# Altium footprint library DSO.PcbLib: 86 footprints (part 5 of 6)
Each footprint in its own frame and in the unit in brackets; x right, y up, seen from the top. Pads: shape width x height; smd on the part's side, far side on the other; paste and mask are expansions set on the pad; w line width, h text height; cw(c..) or ccw(c..) is an arc to the next point about the centre after c.
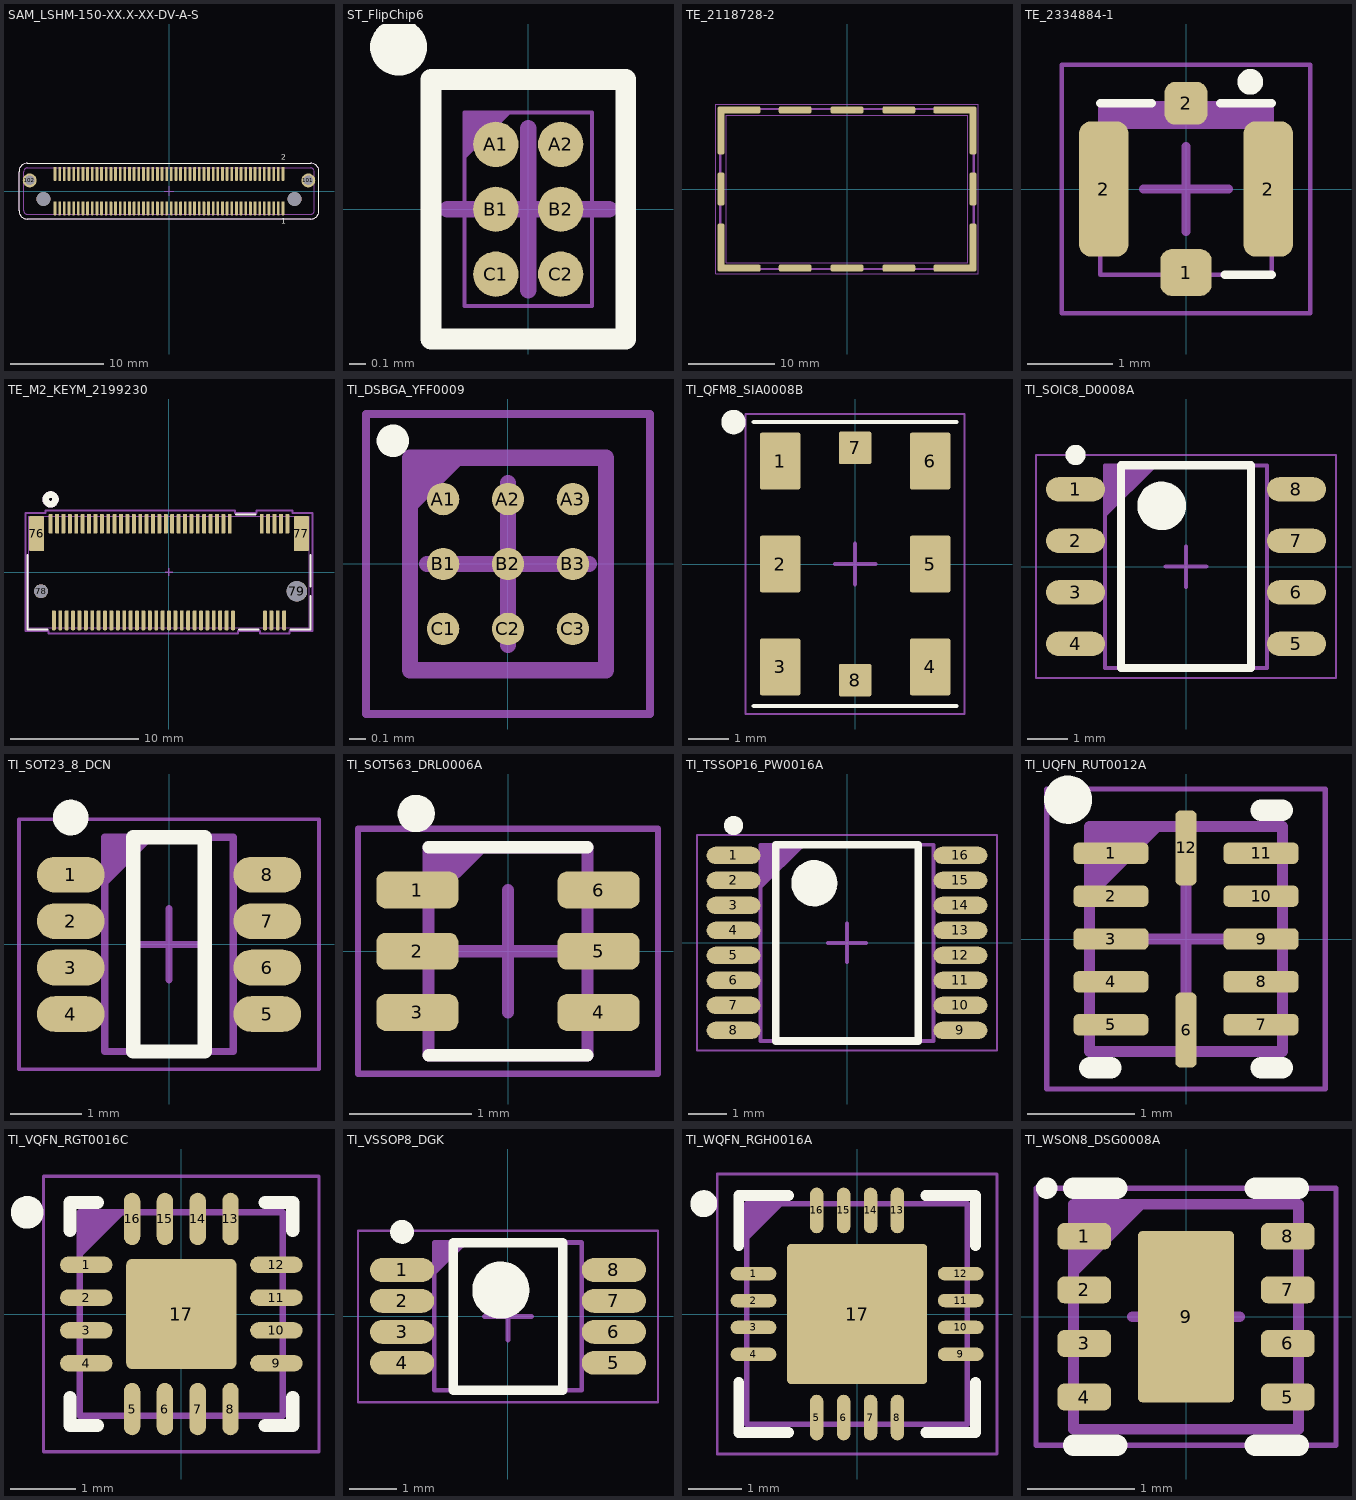
[diagram p4: the footprints below, top view; thin cyan lines are the x and y axes]

## SAM_LSHM-150-XX.X-XX-DV-A-S [mm]
pads (104):
  rrect50% 0.3x1.5 smd: 1(12.25,-1.85) 2(12.25,1.85) 3(11.75,-1.85) 4(11.75,1.85) 5(11.25,-1.85) 6(11.25,1.85) 7(10.75,-1.85) 8(10.75,1.85) 9(10.25,-1.85) 10(10.25,1.85) 11(9.75,-1.85) 12(9.75,1.85) 13(9.25,-1.85) 14(9.25,1.85) 15(8.75,-1.85) 16(8.75,1.85) 17(8.25,-1.85) 18(8.25,1.85) 19(7.75,-1.85) 20(7.75,1.85) 21(7.25,-1.85) 22(7.25,1.85) 23(6.75,-1.85) 24(6.75,1.85) 25(6.25,-1.85) 26(6.25,1.85) 27(5.75,-1.85) 28(5.75,1.85) 29(5.25,-1.85) 30(5.25,1.85) 31(4.75,-1.85) 32(4.75,1.85) 33(4.25,-1.85) 34(4.25,1.85) 35(3.75,-1.85) 36(3.75,1.85) 37(3.25,-1.85) 38(3.25,1.85) 39(2.75,-1.85) 40(2.75,1.85) 41(2.25,-1.85) 42(2.25,1.85) 43(1.75,-1.85) 44(1.75,1.85) 45(1.25,-1.85) 46(1.25,1.85) 47(0.75,-1.85) 48(0.75,1.85) 49(0.25,-1.85) 50(0.25,1.85) 51(-0.25,-1.85) 52(-0.25,1.85) 53(-0.75,-1.85) 54(-0.75,1.85) 55(-1.25,-1.85) 56(-1.25,1.85) 57(-1.75,-1.85) 58(-1.75,1.85) 59(-2.25,-1.85) 60(-2.25,1.85) 61(-2.75,-1.85) 62(-2.75,1.85) 63(-3.25,-1.85) 64(-3.25,1.85) 65(-3.75,-1.85) 66(-3.75,1.85) 67(-4.25,-1.85) 68(-4.25,1.85) 69(-4.75,-1.85) 70(-4.75,1.85) 71(-5.25,-1.85) 72(-5.25,1.85) 73(-5.75,-1.85) 74(-5.75,1.85) 75(-6.25,-1.85) 76(-6.25,1.85) 77(-6.75,-1.85) 78(-6.75,1.85) 79(-7.25,-1.85) 80(-7.25,1.85) 81(-7.75,-1.85) 82(-7.75,1.85) 83(-8.25,-1.85) 84(-8.25,1.85) 85(-8.75,-1.85) 86(-8.75,1.85) 87(-9.25,-1.85) 88(-9.25,1.85) 89(-9.75,-1.85) 90(-9.75,1.85) 91(-10.25,-1.85) 92(-10.25,1.85) 93(-10.75,-1.85) 94(-10.75,1.85) 95(-11.25,-1.85) 96(-11.25,1.85) 97(-11.75,-1.85) 98(-11.75,1.85) 99(-12.25,-1.85) 100(-12.25,1.85)
  round 1.5 hole 1: 101(14.975,1.15) 102(-14.975,1.15)
  round 1.5 hole 1.5 unplated: ""(-13.5,-0.85) ""(13.5,-0.85)
Top Overlay:
  lines w0.1: -16.125,-2.1 ccw(c-15.225,-2.1) -15.225,-3 15.225,-3 ccw(c15.225,-2.1) 16.125,-2.1 16.125,2.1 ccw(c15.225,2.1) 15.225,3 -15.225,3 ccw(c-15.225,2.1) -16.125,2.1 -16.125,-2.1
  text "1" at 12.061,-3.725 h1
  text "2" at 12.064,3.175 h1
Top Courtyard:
  lines w0.05: -16.125,-2.1 ccw(c-15.225,-2.1) -15.225,-3 15.225,-3 ccw(c15.225,-2.1) 16.125,-2.1 16.125,2.1 ccw(c15.225,2.1) 15.225,3 -15.225,3 ccw(c-15.225,2.1) -16.125,2.1 -16.125,-2.1
Top Assembly:
  lines w0.127: -15.625,-2.09 ccw(c-15.225,-2.09) -15.225,-2.49 15.225,-2.49 ccw(c15.225,-2.09) 15.625,-2.09 15.625,2.09 ccw(c15.225,2.09) 15.225,2.49 -15.225,2.49 ccw(c-15.225,2.09) -15.625,2.09 -15.625,-2.09
  text "1" at 12.061,-2.125 h1
  text "2" at 12.064,1.575 h1
  text ".Designator" at -4.953,-0.419 h2
Top Component Center:
  lines w0.1: -0.5,0 0.5,0 ; 0,-0.5 0,0.5
3D body "LSHM-150-04.0-L-DV-A-S-K-TR.stp": height 5.6, standoff -1.65, extent -15.401,-2.49 15.401,2.64

## ST_FlipChip6 [mil] "BGA, 6-Leads, Body 0.78x1.18mmx0.36mm, Pitch 0.40mm"
height 14.57
pads (6):
  round 11 smd paste+0 mask+0: A1(-7.88,15.75) A2(7.88,15.75) B1(-7.88,0) B2(7.88,0) C1(-7.88,-15.75) C2(7.88,-15.75)
Top Overlay:
  circle w9.84: c-31.5,39.37 r1.97
  lines w5: -23.62,-31.5 -23.62,31.5 23.62,31.5 23.62,-31.5 -23.62,-31.5
Top Courtyard:
  lines w1.97: -23.62,-31.5 -23.62,31.5 23.62,31.5 23.62,-31.5 -23.62,-31.5
Top Assembly:
  region: -15.5,12.06 -4.06,23.5 -15.5,23.5
  lines w1: -15.5,-23.5 15.5,-23.5 15.5,23.5 -15.5,23.5 -15.5,-23.5
  text ".Designator" at 6.59,-77.86 h31.5
Top Component Center:
  lines w3.94: -19.68,0 19.69,0 ; 0,-19.69 0,19.68
3D body "BGA_00J105R_STM.step": height 14.09, standoff 0.01, extent -15.51,-23.5 15.51,23.5

## TE_2118728-2 [mm]
height 7
pads (16):
  rrect50% 0.8x5.55 smd: 1(-14.581,6.772) 1(-14.579,-6.772) 1(14.579,6.772) 1(14.581,-6.772)
  rrect50% 0.8x3.8 smd: 1(-14.579,0.003) 1(14.581,0.003)
  rrect50% 4.98x0.8 smd: 1(-12.491,9.147) 1(-12.489,-9.147) 1(12.489,9.147) 1(12.491,-9.147)
  rrect50% 3.8x0.8 smd: 1(-6.001,9.147) 1(-5.999,-9.147) 1(-0.001,9.147) 1(0.001,-9.147) 1(5.999,9.147) 1(6.001,-9.147)
Top Courtyard:
  lines w0.05: -15.2,-9.8 -15.2,9.8 15.2,9.8 15.2,-9.8 -15.2,-9.8 ; -13.975,-8.55 -13.975,8.55 13.975,8.55 13.975,-8.55 -13.975,-8.55
Top Assembly:
  lines w0.254: -14.675,-9.25 -14.675,9.25 14.675,9.25 14.675,-9.25 -14.675,-9.25
  text ".Designator" at -4.953,-0.419 h2
3D body "c-2118728-2-a-3d.stp": height 7, standoff 0, extent -14.68,-9.25 14.68,9.25

## TE_2334884-1 [mm]
height 0.6
pads (4):
  rrect50% 0.6x0.55 smd: 1(0,-0.975)
  rrect50% 0.58x1.58 smd: 2(-0.96,0) 2(0.96,0)
  rrect50% 0.5x0.5 smd: 2(0,1)
Top Overlay:
  circle w0.2: c0.75,1.25 r0.05
  lines w0.1: -1,1 -0.4,1 ; 0.4,1 1,1 ; 0.45,-1 1,-1
Top Courtyard:
  lines w0.05: -1.45,-1.45 -1.45,1.45 1.45,1.45 1.45,-1.45 -1.45,-1.45
Top Assembly:
  rectangle: -1,0.7 1,1
  lines w0.05: -1,-1 1,-1 1,1 -1,1 -1,-1
  text ".Designator" at -2.477,-0.209 h1
Top Component Center:
  lines w0.1: -0.5,0 0.5,0 ; 0,-0.5 0,0.5
3D body "c-2334884-1-a2-3d.stp": height 0.6, standoff 0, extent -1,-1 1,1

## TE_M2_KEYM_2199230 [mil]
pads (71):
  rrect50% 12x61 smd paste+0 mask+0: 1(-364.17,148.62) 2(-354.33,-148.62) 3(-344.49,148.62) 4(-334.65,-148.62) 5(-324.8,148.62) 6(-314.96,-148.62) 7(-305.12,148.62) 8(-295.28,-148.62) 9(-285.43,148.62) 10(-275.59,-148.62) 11(-265.75,148.62) 12(-255.91,-148.62) 13(-246.06,148.62) 14(-236.22,-148.62) 15(-226.38,148.62) 16(-216.54,-148.62) 17(-206.69,148.62) 18(-196.85,-148.62) 19(-187.01,148.62) 20(-177.17,-148.62) 21(-167.32,148.62) 22(-157.48,-148.62) 23(-147.64,148.62) 24(-137.8,-148.62) 25(-127.95,148.62) 26(-118.11,-148.62) 27(-108.27,148.62) 28(-98.43,-148.62) 29(-88.58,148.62) 30(-78.74,-148.62) 31(-68.9,148.62) 32(-59.06,-148.62) 33(-49.21,148.62) 34(-39.37,-148.62) 35(-29.53,148.62) 36(-19.68,-148.62) 37(-9.84,148.62) 38(0,-148.62) 39(9.84,148.62) 40(19.69,-148.62) 41(29.53,148.62) 42(39.37,-148.62) 43(49.21,148.62) 44(59.06,-148.62) 45(68.9,148.62) 46(78.74,-148.62) 47(88.58,148.62) 48(98.43,-148.62) 49(108.27,148.62) 50(118.11,-148.62) 51(127.95,148.62) 52(137.8,-148.62) 53(147.64,148.62) 54(157.48,-148.62) 55(167.32,148.62) 56(177.17,-148.62) 57(187.01,148.62) 58(196.85,-148.62) 67(285.43,148.62) 68(295.28,-148.62) 69(305.12,148.62) 70(314.96,-148.62) 71(324.8,148.62) 72(334.65,-148.62) 73(344.49,148.62) 74(354.33,-148.62) 75(364.17,148.62)
  rrect20% 47x108 smd: 76(-407.48,118.11) 77(407.48,118.11)
  round 43 hole 43 unplated: 78(-393.7,-59.06)
  round 63 hole 63 unplated: 79(393.7,-59.06)
Top Overlay:
  circle w20: c-364.17,223.62 r15
  lines w6: -436,52.01 -436,-176.5 -373.43,-176.5 ; 206.11,176.5 266.33,176.5 ; 215.95,-176.5 276.18,-176.5 ; 373.43,-176.5 436,-176.5 436,-73.2 ; 436,-44.92 436,52.01
Bottom Overlay:
  circle w20: c-364.17,223.62 r15
Top Assembly:
  circle w20: c-364.17,223.62 r15
  lines w1: -431,-171.5 431,-171.5 431,171.5 -431,171.5 -431,-171.5
  lines w6: -440.98,54.11 -440.98,182.11 -380.17,182.11 -380.17,189.12 203.01,189.12 203.01,181.5 269.43,181.5 269.43,189.12 380.17,189.12 380.17,182.11 440.98,182.11 440.98,54.11 ; -441,54.11 -440.98,54.11 ; -441,54.11 -441,-181.5 -370.33,-181.5 -370.33,-189.12 212.85,-189.12 212.85,-181.5 279.28,-181.5 279.28,-189.12 370.33,-189.12 370.33,-181.5 441,-181.5 441,54.11 ; 440.98,54.11 441,54.11
  text ".Designator" at -195,-16.49 h78.74
Top Component Center:
  lines w3.94: -11.81,0 11.81,0 ; 0,-11.81 0,11.81
3D body "c-1-2199230-5-b3-3d.stp": height 161.22, standoff -23.82, extent -431.1,-171.26 431.1,171.26

## TI_DSBGA_YFF0009 [mm] "BGA, 9-Leads, Body 1.21x1.31mmx0.63mm, Pitch 0.40mm"
height 0.63
pads (9):
  round 0.2 smd: A1(-0.4,0.4) A2(0,0.4) A3(0.4,0.4) B1(-0.4,0) B2(0,0) B3(0.4,0) C1(-0.4,-0.4) C2(0,-0.4) C3(0.4,-0.4)
Top Overlay:
  circle w0.1: c-0.71,0.76 r0.05
Top Courtyard:
  lines w0.05: -0.875,-0.925 0.875,-0.925 0.875,0.925 -0.875,0.925 -0.875,-0.925
Top Assembly:
  region: -0.605,0.295 -0.245,0.655 -0.605,0.655
  lines w0.1: -0.605,-0.655 -0.605,0.655 0.605,0.655 0.605,-0.655 -0.605,-0.655
  text ".Designator" at 0.167,-1.978 h0.8
Top Component Center:
  lines w0.1: -0.5,0 0.5,0 ; 0,-0.5 0,0.5
3D body "TI_DSBGA_YFF0009.step": height 0.63, standoff 0, extent -0.605,-0.655 0.605,0.655

## TI_QFM8_SIA0008B [mm]
height 1.15
pads (8):
  rrect10% 1x1.4 smd paste-1.4: 1(-1.85,2.54) 2(-1.85,0) 3(-1.85,-2.54) 4(1.85,-2.54) 5(1.85,0) 6(1.85,2.54)
  rrect10% 0.8x0.8 smd: 7(0,2.865) 8(0,-2.865)
Top Overlay:
  circle w0.4: c-3,3.5 r0.1
  lines w0.1: -2.5,-3.5 2.5,-3.5 ; -2.5,3.5 2.5,3.5
Top Paste:
  rectangle: -2.35,-2.44 -1.35,-1.84
  rectangle: -2.35,0.1 -1.35,0.7
  rectangle: -2.35,-0.7 -1.35,-0.1
  region: 2.35,0.7 1.35,0.7 1.35,0.1 2.35,0.1
  region: 2.35,-0.1 1.35,-0.1 1.35,-0.7 2.35,-0.7
  rectangle: -2.35,-3.24 -1.35,-2.64
  rectangle: -2.35,1.84 -1.35,2.44
  rectangle: -2.35,2.64 -1.35,3.24
  region: 2.35,-1.84 1.35,-1.84 1.35,-2.44 2.35,-2.44
  region: 2.35,-2.64 1.35,-2.64 1.35,-3.24 2.35,-3.24
  region: 2.35,2.44 1.35,2.44 1.35,1.84 2.35,1.84
  region: 2.35,3.24 1.35,3.24 1.35,2.64 2.35,2.64
Top Courtyard:
  lines w0.05: -2.7,-3.7 2.7,-3.7 2.7,3.7 -2.7,3.7 -2.7,-3.7
Top Component Center:
  lines w0.1: -0.5,0 0.5,0 ; 0,-0.5 0,0.5
3D body: height 1.15, standoff 0, extent -2.5,-3.5 2.5,3.5

## TI_SOIC8_D0008A [mm] "SOIC, 8-Leads, Body 4.91x3.90mm, Pitch 1.27mm, Height 1.75mm, IPC Medium Density"
height 1.75
pads (8):
  oval 1.45x0.6 smd: 1(-2.725,1.905) 2(-2.725,0.635) 3(-2.725,-0.635) 4(-2.725,-1.905) 5(2.725,-1.905) 6(2.725,-0.635) 7(2.725,0.635) 8(2.725,1.905)
Top Overlay:
  circle w0.6: c-0.6,1.5 r0.3
  circle w0.25: c-2.725,2.755 r0.125
  lines w0.2: -1.6,-2.5 1.6,-2.5 1.6,2.5 -1.6,2.5 -1.6,-2.5
Top Courtyard:
  lines w0.05: -3.7,-2.75 3.7,-2.75 3.7,2.75 -3.7,2.75 -3.7,-2.75
Top Assembly:
  region: -2,1.2 -0.7,2.5 -2,2.5
  lines w0.1: -2,-2.5 -2,2.5 2,2.5 2,-2.5 -2,-2.5
  text ".Designator" at 0.209,-2.477 h1
Top Component Center:
  lines w0.1: -0.5,0 0.5,0 ; 0,-0.5 0,0.5
3D body "TI_SOIC8_D0008A.step": height 1.75, standoff 0, extent -2.997,-2.5 2.997,2.5

## TI_SOT23_8_DCN [mm] "TSOP, 8-Leads, Body 2.90x1.60mm, Pitch 0.65mm, IPC Medium Density"
height 1.45
pads (8):
  oval 0.95x0.5 smd: 1(-1.375,0.975) 2(-1.375,0.325) 3(-1.375,-0.325) 4(-1.375,-0.975) 5(1.375,-0.975) 6(1.375,-0.325) 7(1.375,0.325) 8(1.375,0.975)
Top Overlay:
  circle w0.25: c-1.375,1.775 r0.125
  lines w0.2: -0.5,-1.5 -0.5,1.5 0.5,1.5 0.5,-1.5 -0.5,-1.5
Top Courtyard:
  lines w0.05: -2.1,-1.75 -2.1,1.75 2.1,1.75 2.1,-1.75 -2.1,-1.75
  lines w0.1: -0.5,0 0.5,0 ; 0,-0.5 0,0.5
Top Assembly:
  region: -0.9,0.8 -0.2,1.5 -0.9,1.5
  lines w0.1: -0.9,-1.5 -0.9,1.5 0.9,1.5 0.9,-1.5 -0.9,-1.5
  text ".Designator" at 0.209,-2.477 h1
3D body "TI_SOT23_8_DCN.step": height 1.45, standoff 0, extent -1.393,-1.5 1.393,1.5

## TI_SOT563_DRL0006A [mm] "SOTFL, 6-Leads, Body 1.60x1.60mm, Pitch 0.50mm, IPC Medium Density"
height 0.6
pads (6):
  rrect50% 0.67x0.3 smd: 1(-0.74,0.5) 2(-0.74,0) 3(-0.74,-0.5) 4(0.74,-0.5) 5(0.74,0) 6(0.74,0.5)
Top Overlay:
  circle w0.155: c-0.75,1.125 r0.075
  lines w0.1: -0.65,-0.85 0.65,-0.85 ; -0.65,0.85 0.65,0.85
Top Courtyard:
  lines w0.05: -1.225,-1 -1.225,1 1.225,1 1.225,-1 -1.225,-1
Top Assembly:
  region: -0.65,0.35 -0.15,0.85 -0.65,0.85
  lines w0.1: -0.65,-0.85 0.65,-0.85 0.65,0.85 -0.65,0.85 -0.65,-0.85
  text ".Designator" at 0.209,-2.477 h1
Top Component Center:
  lines w0.1: -0.5,0 0.5,0 ; 0,-0.5 0,0.5
3D body "TI_SOT563_DRL0006A.step": height 0.6, standoff 0, extent -0.8,-0.848 0.8,0.848

## TI_TSSOP16_PW0016A [mm] "TSOP, 16-Leads, Body 5.00x4.40mm, Pitch 0.65mm, IPC Medium Density"
height 1.2
pads (16):
  oval 1.4x0.45 smd: 1(-2.95,2.275) 2(-2.95,1.625) 3(-2.95,0.975) 4(-2.95,0.325) 5(-2.95,-0.325) 6(-2.95,-0.975) 7(-2.95,-1.625) 8(-2.95,-2.275) 9(2.95,-2.275) 10(2.95,-1.625) 11(2.95,-0.975) 12(2.95,-0.325) 13(2.95,0.325) 14(2.95,0.975) 15(2.95,1.625) 16(2.95,2.275)
Top Overlay:
  circle w0.6: c-0.85,1.55 r0.3
  circle w0.25: c-2.95,3.05 r0.125
  lines w0.2: -1.85,-2.55 1.85,-2.55 1.85,2.55 -1.85,2.55 -1.85,-2.55
Top Courtyard:
  lines w0.05: -3.9,-2.8 3.9,-2.8 3.9,2.8 -3.9,2.8 -3.9,-2.8
Top Assembly:
  region: -2.25,1.375 -1.075,2.55 -2.25,2.55
  lines w0.1: -2.25,-2.55 2.25,-2.55 2.25,2.55 -2.25,2.55 -2.25,-2.55
  text ".Designator" at 0.209,-2.477 h1
Top Component Center:
  lines w0.1: -0.5,0 0.5,0 ; 0,-0.5 0,0.5
3D body "TI_TSSOP16_PW0016A.step": height 1.2, standoff 0, extent -3.2,-2.55 3.2,2.55

## TI_UQFN_RUT0012A [mm]
pads (12):
  rrect50% 0.7x0.2 smd paste+0 mask+0.051: 1(-0.7,0.8) 2(-0.7,0.4) 3(-0.7,0) 4(-0.7,-0.4) 5(-0.7,-0.8) 7(0.7,-0.8) 8(0.7,-0.4) 9(0.7,0) 10(0.7,0.4) 11(0.7,0.8)
  rrect50% 0.2x0.7 smd paste+0 mask+0.051: 6(0,-0.85) 12(0,0.85)
Top Overlay:
  circle w0.25: c-1.1,1.3 r0.1
  lines w0.2: -0.9,-1.2 -0.7,-1.2 ; 0.7,-1.2 0.9,-1.2 ; 0.7,1.2 0.9,1.2
Top Courtyard:
  lines w0.05: -1.3,-1.4 1.3,-1.4 1.3,1.4 -1.3,1.4 -1.3,-1.4
Top Assembly:
  region: -0.9,0.35 -0.2,1.05 -0.9,1.05
  lines w0.1: -0.9,-1.05 -0.9,1.05 0.9,1.05 0.9,-1.05 -0.9,-1.05
  text ".Designator" at 0.209,-2.477 h1
Top Component Center:
  lines w0.1: -0.5,0 0.5,0 ; 0,-0.5 0,0.5
3D body "TI_UQFN_RUT.step": height 0.55, standoff 0, extent -0.901,-1.051 0.901,1.051

## TI_VQFN_RGT0016C [mm] "QFN, 16-Leads, Body 3.00x3.00mm, Pitch 0.50mm, Thermal Pad 1.68x1.68mm, IPC Medium Density"
height 1
pads (17):
  oval 0.8x0.25 smd: 1(-1.45,0.75) 2(-1.45,0.25) 3(-1.45,-0.25) 4(-1.45,-0.75) 9(1.45,-0.75) 10(1.45,-0.25) 11(1.45,0.25) 12(1.45,0.75)
  oval 0.25x0.8 smd: 5(-0.75,-1.45) 6(-0.25,-1.45) 7(0.25,-1.45) 8(0.75,-1.45) 13(0.75,1.45) 14(0.25,1.45) 15(-0.25,1.45) 16(-0.75,1.45)
  rrect10% 1.68x1.68 smd paste-0.1: 17(0,0)
Top Overlay:
  circle w0.25: c-2.35,1.55 r0.125
  lines w0.2: -1.7,-1.275 -1.7,-1.7 -1.275,-1.7 ; -1.7,1.275 -1.7,1.7 -1.275,1.7 ; 1.275,-1.7 1.7,-1.7 1.7,-1.275 ; 1.275,1.7 1.7,1.7 1.7,1.275
Top Courtyard:
  lines w0.05: -2.1,-2.1 2.1,-2.1 2.1,2.1 -2.1,2.1 -2.1,-2.1
Top Assembly:
  region: -1.55,0.85 -0.85,1.55 -1.55,1.55
  lines w0.1: -1.55,-1.55 -1.55,1.55 1.55,1.55 1.55,-1.55 -1.55,-1.55
  text ".Designator" at -2.477,-0.209 h1
Top Component Center:
  lines w0.1: -0.5,0 0.5,0 ; 0,-0.5 0,0.5
3D body "TI_VQFN_RGT0016C.step": height 1, standoff 0, extent -1.551,-1.551 1.551,1.551

## TI_VSSOP8_DGK [mm] "TSOP, 8-Leads, Body 3.00x3.00mm, Pitch 0.65mm, IPC Medium Density"
height 1.1
pads (8):
  oval 1.35x0.5 smd: 1(-2.225,0.975) 2(-2.225,0.325) 3(-2.225,-0.325) 4(-2.225,-0.975) 5(2.225,-0.975) 6(2.225,-0.325) 7(2.225,0.325) 8(2.225,0.975)
Top Overlay:
  circle w0.25: c-2.225,1.775 r0.125
  circle w0.6: c-0.15,0.55 r0.3
  lines w0.2: -1.15,-1.55 -1.15,1.55 1.15,1.55 1.15,-1.55 -1.15,-1.55
Top Courtyard:
  lines w0.05: -3.15,-1.8 -3.15,1.8 3.15,1.8 3.15,-1.8 -3.15,-1.8
Top Assembly:
  region: -1.55,0.85 -0.85,1.55 -1.55,1.55
  lines w0.1: -1.55,-1.55 -1.55,1.55 1.55,1.55 1.55,-1.55 -1.55,-1.55
  text ".Designator" at 0.209,-2.477 h1
Top Component Center:
  lines w0.1: -0.5,0 0.5,0 ; 0,-0.5 0,0.5
3D body "TI_VSSOP8_DGK.step": height 1.1, standoff 0, extent -2.45,-1.55 2.45,1.55

## TI_WQFN_RGH0016A [mm] "QFN, 16-Leads, Body 4.00x4.00mm, Pitch 0.50mm, Thermal Pad 2.60x2.60mm, IPC Medium Density"
height 0.8
pads (17):
  oval 0.85x0.25 smd: 1(-1.925,0.75) 2(-1.925,0.25) 3(-1.925,-0.25) 4(-1.925,-0.75) 9(1.925,-0.75) 10(1.925,-0.25) 11(1.925,0.25) 12(1.925,0.75)
  oval 0.25x0.85 smd: 5(-0.75,-1.925) 6(-0.25,-1.925) 7(0.25,-1.925) 8(0.75,-1.925) 13(0.75,1.925) 14(0.25,1.925) 15(-0.25,1.925) 16(-0.75,1.925)
  rrect5% 2.6x2.6 smd paste-1.3: 17(0,0)
Top Overlay:
  circle w0.25: c-2.85,2.05 r0.125
  lines w0.2: -2.2,-1.275 -2.2,-2.2 -1.275,-2.2 ; -2.2,1.275 -2.2,2.2 -1.275,2.2 ; 1.275,-2.2 2.2,-2.2 2.2,-1.275 ; 1.275,2.2 2.2,2.2 2.2,1.275
Top Paste:
  rectangle: 0.1,0.1 1.25,1.25
  rectangle: -1.25,0.1 -0.1,1.25
  rectangle: -1.25,-1.25 -0.1,-0.1
  rectangle: 0.1,-1.25 1.25,-0.1
Top Courtyard:
  lines w0.05: -2.6,-2.6 -2.6,2.6 2.6,2.6 2.6,-2.6 -2.6,-2.6
Top Assembly:
  region: -2.05,1.35 -1.35,2.05 -2.05,2.05
  lines w0.1: -2.05,-2.05 -2.05,2.05 2.05,2.05 2.05,-2.05 -2.05,-2.05
  text ".Designator" at -2.477,-0.209 h1
Top Component Center:
  lines w0.1: -0.5,0 0.5,0 ; 0,-0.5 0,0.5
3D body "TI_WQFN_RGH0016A.step": height 0.8, standoff 0, extent -2.051,-2.051 2.051,2.051

## TI_WSON8_DSG0008A [mm] "SON, 8-Leads, Body 2.00x2.00mm, Pitch 0.50mm, Thermal Pad 1.60x0.69mm, IPC Medium Density"
height 0.8
pads (9):
  rrect50% 0.5x0.25 smd: 1(-0.95,0.75) 2(-0.95,0.25) 3(-0.95,-0.25) 4(-0.95,-0.75) 5(0.95,-0.75) 6(0.95,-0.25) 7(0.95,0.25) 8(0.95,0.75)
  rrect10% 0.9x1.6 smd paste-0.9: 9(0,0)
Top Overlay:
  circle w0.1: c-1.3,1.2 r0.05
  lines w0.2: -1.05,-1.2 -0.645,-1.2 ; -1.05,1.2 -0.645,1.2 ; 0.645,-1.2 1.05,-1.2 ; 0.645,1.2 1.05,1.2
Top Paste:
  rectangle: -0.45,-0.8 0.45,-0.1
  rectangle: -0.45,0.1 0.45,0.8
Top Courtyard:
  lines w0.05: -1.4,-1.2 -1.4,1.2 1.4,1.2 1.4,-1.2 -1.4,-1.2
Top Assembly:
  region: -1.05,0.35 -0.35,1.05 -1.05,1.05
  lines w0.1: -1.05,-1.05 -1.05,1.05 1.05,1.05 1.05,-1.05 -1.05,-1.05
  text ".Designator" at 0.209,-2.477 h1
Top Component Center:
  lines w0.1: -0.5,0 0.5,0 ; 0,-0.5 0,0.5
3D body "SON127P600-8N.step": height 0.8, standoff 0, extent -1.051,-1.05 1.051,1.05